# Altium schematic symbol library FPGA_Xilinx_Virtex7.SchLib: 34 symbols (part 14 of 26) (continued)
## XC7VX485T-FFG1930 (continued)
part R pins: AA3 GND, AA4 GND, AA7 GND, AA8 GND, AA9 GND, AA12 GND, AA14 GND, AA16 GND, AA18 GND, AA20 GND, AA24 GND, AA26 GND, AA28 GND, AA30 GND, AA32 GND, AA42 GND, AB1 GND, AB5 GND, AB9 GND, AB13 GND, AB15 GND, AB17 GND, AB19 GND, AB21 GND, AB25 GND, AB27 GND, AB29 GND, AB31 GND, AB33 GND, AB39 GND, AC3 GND, AC7 GND, AC9 GND, AC12 GND, AC14 GND, AC16 GND, AC18 GND, AC20 GND, AC24 GND, AC26 GND, AC28 GND, AC30 GND, AC32 GND, AC36 GND, AD1 GND, AD2 GND, AD5 GND, AD6 GND, AD9 GND, AD13 GND, AD15 GND, AD17 GND, AD19 GND, AD21 GND, AD25 GND, AD27 GND, AD29 GND, AD31 GND, AD33 GND, AD43 GND, AE3 GND, AE4 GND, AE7 GND, AE8 GND, AE9 GND, AE12 GND, AE14 GND, AE16 GND, AE18 GND, AE20 GND, AE22 GND, AE24 GND, AE26 GND, AE28 GND, AE30 GND, AE32 GND, AE40 GND, AF1 GND, AF5 GND, AF9 GND, AF13 GND, AF15 GND, AF17 GND, AF19 GND, AF21 GND, AF23 GND, AF25 GND, AF27 GND, AF29 GND, AF31 GND, AF33 GND, AF37 GND, AG3 GND, AG7 GND, AG9 GND, AG12 GND, AG14 GND, AG16 GND, AG18 GND, AG20 GND, AG22 GND, AG24 GND, AG26 GND, AG28 GND, AG30 GND, AG32 GND, AG34 GND, AG44 GND, AH1 GND, AH2 GND, AH5 GND, AH7 GND, AH8 GND, AH9 GND, AH13 GND, AH21 GND, AH31 GND, AH33 GND, AH41 GND, AJ3 GND, AJ4 GND, AJ7 GND, AJ9 GND, AJ18 GND, AJ28 GND, AJ38 GND, AK1 GND, AK5 GND, AK9 GND, AK15 GND, AK25 GND, AK35 GND, AL3 GND, AL7 GND, AL9 GND, AL12 GND, AL22 GND, AL32 GND, AL42 GND, AM1 GND, AM2 GND, AM5 GND, AM6 GND, AM9 GND, AM19 GND, AM29 GND, AM39 GND, AN3 GND, AN4 GND, AN7 GND, AN8 GND, AN9 GND, AN16 GND, AN26 GND, AN36 GND, AP1 GND, AP5 GND, AP9 GND, AP13 GND, AP23 GND, AP33 GND, AP43 GND, AR3 GND, AR7 GND, AR9 GND, AR10 GND, AR20 GND, AR30 GND, AR40 GND, AT1 GND, AT2 GND, AT5 GND, AT6 GND, AT9 GND, AT17 GND, AT27 GND, AT37 GND, AU3 GND, AU4 GND, AU7 GND, AU8 GND, AU9 GND, AU14 GND, AU24 GND, AU34 GND, AU44 GND, AV1 GND, AV5 GND, AV9 GND, AV11 GND, AV21 GND, AV31 GND, AV41 GND, AW3 GND, AW7 GND, AW9 GND, AW18 GND, AW28 GND, AW38 GND, AY1 GND, AY2 GND, AY5 GND, AY6 GND, AY9 GND, AY15 GND, AY25 GND, AY35 GND, BA3 GND, BA4 GND, BA7 GND, BA8 GND, BA9 GND, BA12 GND, BA22 GND, BA32 GND, BA42 GND, BB1 GND, BB5 GND, BB9 GND, BB19 GND, BB29 GND, BB39 GND, BC2 GND, BC3 GND, BC7 GND, BC9 GND, BC16 GND, BC26 GND, BC36 GND, BD5 GND, BD6 GND, BD9 GND, BD13 GND, BD23 GND, BD33 GND, U44 GND, V1 GND, V5 GND, V9 GND, V13 GND, V15 GND, V17 GND, V19 GND, V21 GND, V23 GND, V25 GND, V27 GND, V29 GND, V31 GND, V33 GND, V41 GND, W3 GND, W7 GND, W9 GND, W12 GND, W14 GND, W16 GND, W18 GND, W20 GND, W22 GND, W24 GND, W26 GND, W28 GND, W30 GND, W32 GND, W38 GND, Y1 GND, Y2 GND, Y5 GND, Y6 GND, Y9 GND, Y13 GND, Y15 GND, Y17 GND, Y19 GND, Y21 GND, Y23 GND, Y25 GND, Y27 GND, Y29 GND, Y31 GND, Y33 GND, Y35 GND

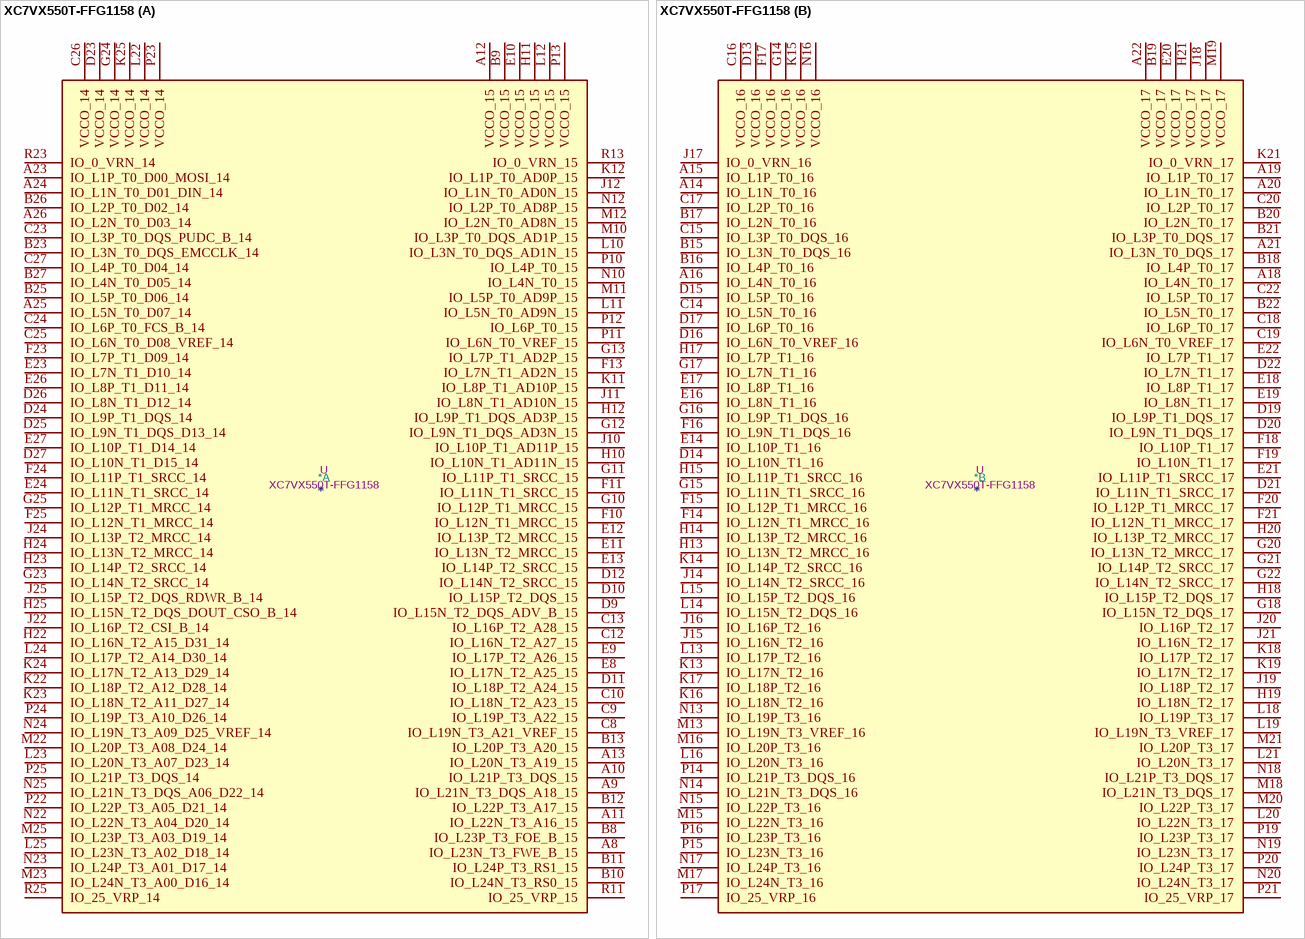
[diagram p97: symbol XC7VX550T-FFG1158]

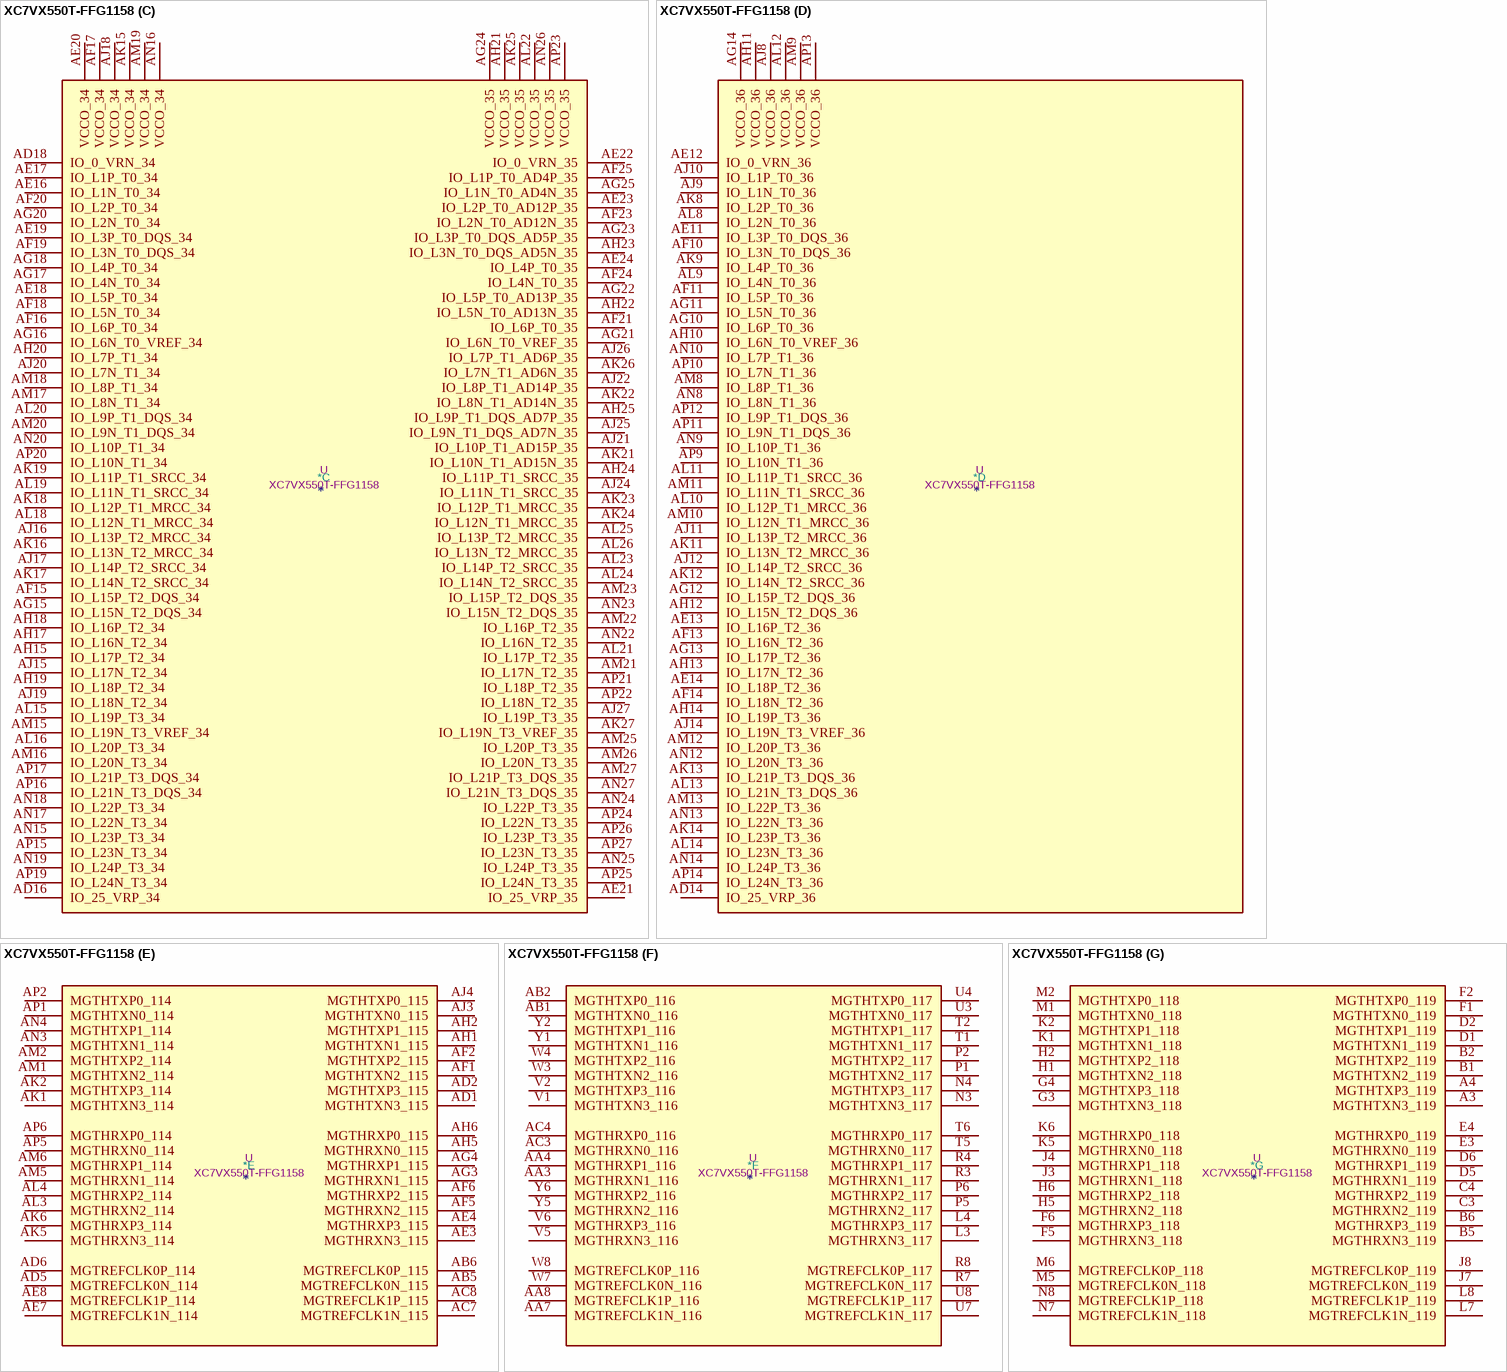
[diagram p98: symbol XC7VX550T-FFG1158]

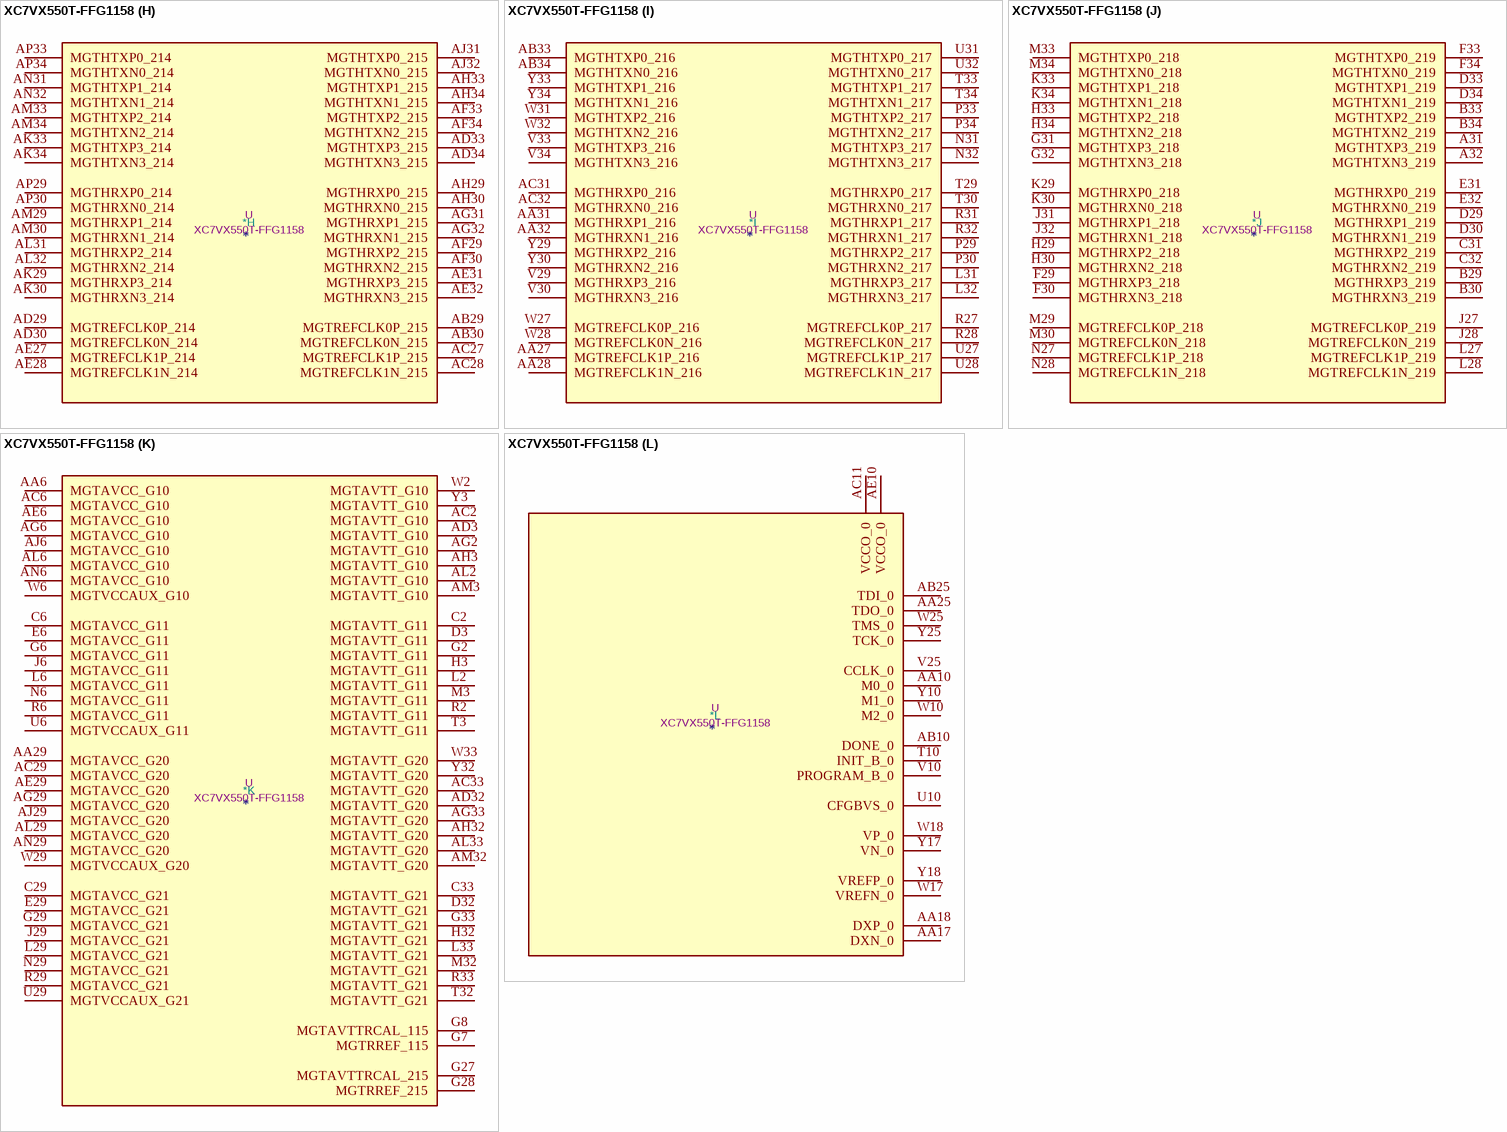
[diagram p99: symbol XC7VX550T-FFG1158]

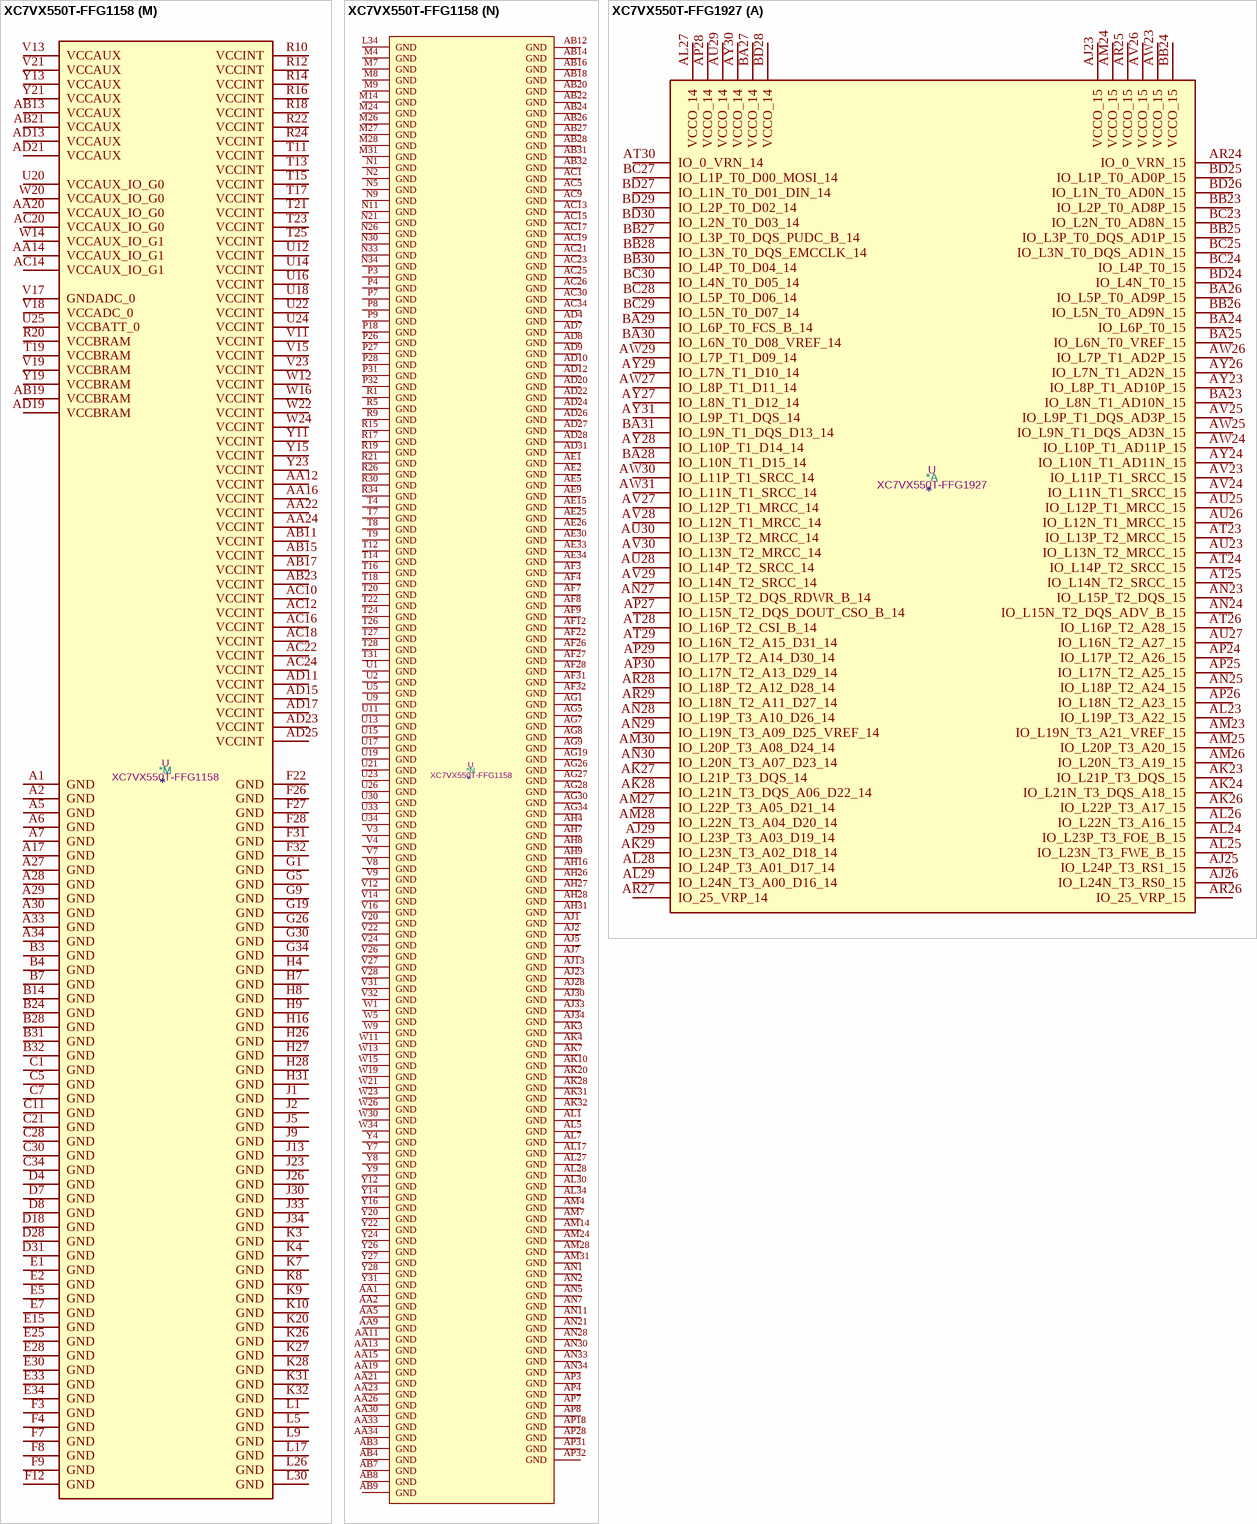
[diagram p100: symbols XC7VX550T-FFG1158 to XC7VX550T-FFG1927]

## XC7VX550T-FFG1158
designator *  value XC7VX550T-FFG1158  Reference: U
ki_keywords: FPGA; ki_description: Virtex 7 XT 550 XC7VX550T-FFG1158
part A pins: A8 IO_L23N_T3_FWE_B_15, A9 IO_L21N_T3_DQS_A18_15, A10 IO_L21P_T3_DQS_15, A11 IO_L22N_T3_A16_15, A12 VCCO_15, A13 IO_L20N_T3_A19_15, A23 IO_L1P_T0_D00_MOSI_14, A24 IO_L1N_T0_D01_DIN_14, A25 IO_L5N_T0_D07_14, A26 IO_L2N_T0_D03_14, B8 IO_L23P_T3_FOE_B_15, B9 VCCO_15, B10 IO_L24N_T3_RS0_15, B11 IO_L24P_T3_RS1_15, B12 IO_L22P_T3_A17_15, B13 IO_L20P_T3_A20_15, B23 IO_L3N_T0_DQS_EMCCLK_14, B25 IO_L5P_T0_D06_14, B26 IO_L2P_T0_D02_14, B27 IO_L4N_T0_D05_14, C8 IO_L19N_T3_A21_VREF_15, C9 IO_L19P_T3_A22_15, C10 IO_L18N_T2_A23_15, C12 IO_L16N_T2_A27_15, C13 IO_L16P_T2_A28_15, C23 IO_L3P_T0_DQS_PUDC_B_14, C24 IO_L6P_T0_FCS_B_14, C25 IO_L6N_T0_D08_VREF_14, C26 VCCO_14, C27 IO_L4P_T0_D04_14, D9 IO_L15N_T2_DQS_ADV_B_15, D10 IO_L15P_T2_DQS_15, D11 IO_L18P_T2_A24_15, D12 IO_L14N_T2_SRCC_15, D23 VCCO_14, D24 IO_L9P_T1_DQS_14, D25 IO_L9N_T1_DQS_D13_14, D26 IO_L8N_T1_D12_14, D27 IO_L10N_T1_D15_14, E8 IO_L17N_T2_A25_15, E9 IO_L17P_T2_A26_15, E10 VCCO_15, E11 IO_L13N_T2_MRCC_15, E12 IO_L13P_T2_MRCC_15, E13 IO_L14P_T2_SRCC_15, E23 IO_L7N_T1_D10_14, E24 IO_L11N_T1_SRCC_14, E26 IO_L8P_T1_D11_14, E27 IO_L10P_T1_D14_14, F10 IO_L12N_T1_MRCC_15, F11 IO_L11N_T1_SRCC_15, F13 IO_L7N_T1_AD2N_15, F23 IO_L7P_T1_D09_14, F24 IO_L11P_T1_SRCC_14, F25 IO_L12N_T1_MRCC_14, G10 IO_L12P_T1_MRCC_15, G11 IO_L11P_T1_SRCC_15, G12 IO_L9N_T1_DQS_AD3N_15, G13 IO_L7P_T1_AD2P_15, G23 IO_L14N_T2_SRCC_14, G24 VCCO_14, G25 IO_L12P_T1_MRCC_14, H10 IO_L10N_T1_AD11N_15, H11 VCCO_15, H12 IO_L9P_T1_DQS_AD3P_15, H22 IO_L16N_T2_A15_D31_14, H23 IO_L14P_T2_SRCC_14, H24 IO_L13N_T2_MRCC_14, H25 IO_L15N_T2_DQS_DOUT_CSO_B_14, J10 IO_L10P_T1_AD11P_15, J11 IO_L8N_T1_AD10N_15, J12 IO_L1N_T0_AD0N_15, J22 IO_L16P_T2_CSI_B_14, J24 IO_L13P_T2_MRCC_14, J25 IO_L15P_T2_DQS_RDWR_B_14, K11 IO_L8P_T1_AD10P_15, K12 IO_L1P_T0_AD0P_15, K22 IO_L18P_T2_A12_D28_14, K23 IO_L18N_T2_A11_D27_14, K24 IO_L17N_T2_A13_D29_14, K25 VCCO_14, L10 IO_L3N_T0_DQS_AD1N_15, L11 IO_L5N_T0_AD9N_15, L12 VCCO_15, L22 VCCO_14, L23 IO_L20N_T3_A07_D23_14, L24 IO_L17P_T2_A14_D30_14, L25 IO_L23N_T3_A02_D18_14, M10 IO_L3P_T0_DQS_AD1P_15, M11 IO_L5P_T0_AD9P_15, M12 IO_L2N_T0_AD8N_15, M22 IO_L20P_T3_A08_D24_14, M23 IO_L24N_T3_A00_D16_14, M25 IO_L23P_T3_A03_D19_14, N10 IO_L4N_T0_15, N12 IO_L2P_T0_AD8P_15, N22 IO_L22N_T3_A04_D20_14, N23 IO_L24P_T3_A01_D17_14, N24 IO_L19N_T3_A09_D25_VREF_14, N25 IO_L21N_T3_DQS_A06_D22_14, P10 IO_L4P_T0_15, P11 IO_L6N_T0_VREF_15, P12 IO_L6P_T0_15, P13 VCCO_15, P22 IO_L22P_T3_A05_D21_14, P23 VCCO_14, P24 IO_L19P_T3_A10_D26_14, P25 IO_L21P_T3_DQS_14, R11 IO_25_VRP_15, R13 IO_0_VRN_15, R23 IO_0_VRN_14, R25 IO_25_VRP_14
part B pins: A14 IO_L1N_T0_16, A15 IO_L1P_T0_16, A16 IO_L4N_T0_16, A18 IO_L4N_T0_17, A19 IO_L1P_T0_17, A20 IO_L1N_T0_17, A21 IO_L3N_T0_DQS_17, A22 VCCO_17, B15 IO_L3N_T0_DQS_16, B16 IO_L4P_T0_16, B17 IO_L2N_T0_16, B18 IO_L4P_T0_17, B19 VCCO_17, B20 IO_L2N_T0_17, B21 IO_L3P_T0_DQS_17, B22 IO_L5N_T0_17, C14 IO_L5N_T0_16, C15 IO_L3P_T0_DQS_16, C16 VCCO_16, C17 IO_L2P_T0_16, C18 IO_L6P_T0_17, C19 IO_L6N_T0_VREF_17, C20 IO_L2P_T0_17, C22 IO_L5P_T0_17, D13 VCCO_16, D14 IO_L10N_T1_16, D15 IO_L5P_T0_16, D16 IO_L6N_T0_VREF_16, D17 IO_L6P_T0_16, D19 IO_L9P_T1_DQS_17, D20 IO_L9N_T1_DQS_17, D21 IO_L11N_T1_SRCC_17, D22 IO_L7N_T1_17, E14 IO_L10P_T1_16, E16 IO_L8N_T1_16, E17 IO_L8P_T1_16, E18 IO_L8P_T1_17, E19 IO_L8N_T1_17, E20 VCCO_17, E21 IO_L11P_T1_SRCC_17, E22 IO_L7P_T1_17, F14 IO_L12N_T1_MRCC_16, F15 IO_L12P_T1_MRCC_16, F16 IO_L9N_T1_DQS_16, F17 VCCO_16, F18 IO_L10P_T1_17, F19 IO_L10N_T1_17, F20 IO_L12P_T1_MRCC_17, F21 IO_L12N_T1_MRCC_17, G14 VCCO_16, G15 IO_L11N_T1_SRCC_16, G16 IO_L9P_T1_DQS_16, G17 IO_L7N_T1_16, G18 IO_L15N_T2_DQS_17, G20 IO_L13N_T2_MRCC_17, G21 IO_L14P_T2_SRCC_17, G22 IO_L14N_T2_SRCC_17, H13 IO_L13N_T2_MRCC_16, H14 IO_L13P_T2_MRCC_16, H15 IO_L11P_T1_SRCC_16, H17 IO_L7P_T1_16, H18 IO_L15P_T2_DQS_17, H19 IO_L18N_T2_17, H20 IO_L13P_T2_MRCC_17, H21 VCCO_17, J14 IO_L14N_T2_SRCC_16, J15 IO_L16N_T2_16, J16 IO_L16P_T2_16, J17 IO_0_VRN_16, J18 VCCO_17, J19 IO_L18P_T2_17, J20 IO_L16P_T2_17, J21 IO_L16N_T2_17, K13 IO_L17N_T2_16, K14 IO_L14P_T2_SRCC_16, K15 VCCO_16, K16 IO_L18N_T2_16, K17 IO_L18P_T2_16, K18 IO_L17P_T2_17, K19 IO_L17N_T2_17, K21 IO_0_VRN_17, L13 IO_L17P_T2_16, L14 IO_L15N_T2_DQS_16, L15 IO_L15P_T2_DQS_16, L16 IO_L20N_T3_16, L18 IO_L19P_T3_17, L19 IO_L19N_T3_VREF_17, L20 IO_L22N_T3_17, L21 IO_L20N_T3_17, M13 IO_L19N_T3_VREF_16, M15 IO_L22N_T3_16, M16 IO_L20P_T3_16, M17 IO_L24N_T3_16, M18 IO_L21N_T3_DQS_17, M19 VCCO_17, M20 IO_L22P_T3_17, M21 IO_L20P_T3_17, N13 IO_L19P_T3_16, N14 IO_L21N_T3_DQS_16, N15 IO_L22P_T3_16, N16 VCCO_16, N17 IO_L24P_T3_16, N18 IO_L21P_T3_DQS_17, N19 IO_L23N_T3_17, N20 IO_L24N_T3_17, P14 IO_L21P_T3_DQS_16, P15 IO_L23N_T3_16, P16 IO_L23P_T3_16, P17 IO_25_VRP_16, P19 IO_L23P_T3_17, P20 IO_L24P_T3_17, P21 IO_25_VRP_17
part C pins: AD16 IO_25_VRP_34, AD18 IO_0_VRN_34, AE16 IO_L1N_T0_34, AE17 IO_L1P_T0_34, AE18 IO_L5P_T0_34, AE19 IO_L3P_T0_DQS_34, AE20 VCCO_34, AE21 IO_25_VRP_35, AE22 IO_0_VRN_35, AE23 IO_L2P_T0_AD12P_35, AE24 IO_L4P_T0_35, AF15 IO_L15P_T2_DQS_34, AF16 IO_L6P_T0_34, AF17 VCCO_34, AF18 IO_L5N_T0_34, AF19 IO_L3N_T0_DQS_34, AF20 IO_L2P_T0_34, AF21 IO_L6P_T0_35, AF23 IO_L2N_T0_AD12N_35, AF24 IO_L4N_T0_35, AF25 IO_L1P_T0_AD4P_35, AG15 IO_L15N_T2_DQS_34, AG16 IO_L6N_T0_VREF_34, AG17 IO_L4N_T0_34, AG18 IO_L4P_T0_34, AG20 IO_L2N_T0_34, AG21 IO_L6N_T0_VREF_35, AG22 IO_L5P_T0_AD13P_35, AG23 IO_L3P_T0_DQS_AD5P_35, AG24 VCCO_35, AG25 IO_L1N_T0_AD4N_35, AH15 IO_L17P_T2_34, AH17 IO_L16N_T2_34, AH18 IO_L16P_T2_34, AH19 IO_L18P_T2_34, AH20 IO_L7P_T1_34, AH21 VCCO_35, AH22 IO_L5N_T0_AD13N_35, AH23 IO_L3N_T0_DQS_AD5N_35, AH24 IO_L11P_T1_SRCC_35, AH25 IO_L9P_T1_DQS_AD7P_35, AJ15 IO_L17N_T2_34, AJ16 IO_L13P_T2_MRCC_34, AJ17 IO_L14P_T2_SRCC_34, AJ18 VCCO_34, AJ19 IO_L18N_T2_34, AJ20 IO_L7N_T1_34, AJ21 IO_L10P_T1_AD15P_35, AJ22 IO_L8P_T1_AD14P_35, AJ24 IO_L11N_T1_SRCC_35, AJ25 IO_L9N_T1_DQS_AD7N_35, AJ26 IO_L7P_T1_AD6P_35, AJ27 IO_L19P_T3_35, AK15 VCCO_34, AK16 IO_L13N_T2_MRCC_34, AK17 IO_L14N_T2_SRCC_34, AK18 IO_L12P_T1_MRCC_34, AK19 IO_L11P_T1_SRCC_34, AK21 IO_L10N_T1_AD15N_35, AK22 IO_L8N_T1_AD14N_35, AK23 IO_L12P_T1_MRCC_35, AK24 IO_L12N_T1_MRCC_35, AK25 VCCO_35, AK26 IO_L7N_T1_AD6N_35, AK27 IO_L19N_T3_VREF_35, AL15 IO_L19P_T3_34, AL16 IO_L20P_T3_34, AL18 IO_L12N_T1_MRCC_34, AL19 IO_L11N_T1_SRCC_34, AL20 IO_L9P_T1_DQS_34, AL21 IO_L17P_T2_35, AL22 VCCO_35, AL23 IO_L14P_T2_SRCC_35, AL24 IO_L14N_T2_SRCC_35, AL25 IO_L13P_T2_MRCC_35, AL26 IO_L13N_T2_MRCC_35, AM15 IO_L19N_T3_VREF_34, AM16 IO_L20N_T3_34, AM17 IO_L8N_T1_34, AM18 IO_L8P_T1_34, AM19 VCCO_34, AM20 IO_L9N_T1_DQS_34, AM21 IO_L17N_T2_35, AM22 IO_L16P_T2_35, AM23 IO_L15P_T2_DQS_35, AM25 IO_L20P_T3_35, AM26 IO_L20N_T3_35, AM27 IO_L21P_T3_DQS_35, AN15 IO_L23P_T3_34, AN16 VCCO_34, AN17 IO_L22N_T3_34, AN18 IO_L22P_T3_34, AN19 IO_L24P_T3_34, AN20 IO_L10P_T1_34, AN22 IO_L16N_T2_35, AN23 IO_L15N_T2_DQS_35, AN24 IO_L22P_T3_35, AN25 IO_L24P_T3_35, AN26 VCCO_35, AN27 IO_L21N_T3_DQS_35, AP15 IO_L23N_T3_34, AP16 IO_L21N_T3_DQS_34, AP17 IO_L21P_T3_DQS_34, AP19 IO_L24N_T3_34, AP20 IO_L10N_T1_34, AP21 IO_L18P_T2_35, AP22 IO_L18N_T2_35, AP23 VCCO_35, AP24 IO_L22N_T3_35, AP25 IO_L24N_T3_35, AP26 IO_L23P_T3_35, AP27 IO_L23N_T3_35
part D pins: AD14 IO_25_VRP_36, AE11 IO_L3P_T0_DQS_36, AE12 IO_0_VRN_36, AE13 IO_L16P_T2_36, AE14 IO_L18P_T2_36, AF10 IO_L3N_T0_DQS_36, AF11 IO_L5P_T0_36, AF13 IO_L16N_T2_36, AF14 IO_L18N_T2_36, AG10 IO_L6P_T0_36, AG11 IO_L5N_T0_36, AG12 IO_L15P_T2_DQS_36, AG13 IO_L17P_T2_36, AG14 VCCO_36, AH10 IO_L6N_T0_VREF_36, AH11 VCCO_36, AH12 IO_L15N_T2_DQS_36, AH13 IO_L17N_T2_36, AH14 IO_L19P_T3_36, AJ8 VCCO_36, AJ9 IO_L1N_T0_36, AJ10 IO_L1P_T0_36, AJ11 IO_L13P_T2_MRCC_36, AJ12 IO_L14P_T2_SRCC_36, AJ14 IO_L19N_T3_VREF_36, AK8 IO_L2P_T0_36, AK9 IO_L4P_T0_36, AK11 IO_L13N_T2_MRCC_36, AK12 IO_L14N_T2_SRCC_36, AK13 IO_L21P_T3_DQS_36, AK14 IO_L23P_T3_36, AL8 IO_L2N_T0_36, AL9 IO_L4N_T0_36, AL10 IO_L12P_T1_MRCC_36, AL11 IO_L11P_T1_SRCC_36, AL12 VCCO_36, AL13 IO_L21N_T3_DQS_36, AL14 IO_L23N_T3_36, AM8 IO_L8P_T1_36, AM9 VCCO_36, AM10 IO_L12N_T1_MRCC_36, AM11 IO_L11N_T1_SRCC_36, AM12 IO_L20P_T3_36, AM13 IO_L22P_T3_36, AN8 IO_L8N_T1_36, AN9 IO_L10P_T1_36, AN10 IO_L7P_T1_36, AN12 IO_L20N_T3_36, AN13 IO_L22N_T3_36, AN14 IO_L24P_T3_36, AP9 IO_L10N_T1_36, AP10 IO_L7N_T1_36, AP11 IO_L9N_T1_DQS_36, AP12 IO_L9P_T1_DQS_36, AP13 VCCO_36, AP14 IO_L24N_T3_36
part E pins: AB5 MGTREFCLK0N_115, AB6 MGTREFCLK0P_115, AC7 MGTREFCLK1N_115, AC8 MGTREFCLK1P_115, AD1 MGTHTXN3_115, AD2 MGTHTXP3_115, AD5 MGTREFCLK0N_114, AD6 MGTREFCLK0P_114, AE3 MGTHRXN3_115, AE4 MGTHRXP3_115, AE7 MGTREFCLK1N_114, AE8 MGTREFCLK1P_114, AF1 MGTHTXN2_115, AF2 MGTHTXP2_115, AF5 MGTHRXN2_115, AF6 MGTHRXP2_115, AG3 MGTHRXN1_115, AG4 MGTHRXP1_115, AH1 MGTHTXN1_115, AH2 MGTHTXP1_115, AH5 MGTHRXN0_115, AH6 MGTHRXP0_115, AJ3 MGTHTXN0_115, AJ4 MGTHTXP0_115, AK1 MGTHTXN3_114, AK2 MGTHTXP3_114, AK5 MGTHRXN3_114, AK6 MGTHRXP3_114, AL3 MGTHRXN2_114, AL4 MGTHRXP2_114, AM1 MGTHTXN2_114, AM2 MGTHTXP2_114, AM5 MGTHRXN1_114, AM6 MGTHRXP1_114, AN3 MGTHTXN1_114, AN4 MGTHTXP1_114, AP1 MGTHTXN0_114, AP2 MGTHTXP0_114, AP5 MGTHRXN0_114, AP6 MGTHRXP0_114
part F pins: AA3 MGTHRXN1_116, AA4 MGTHRXP1_116, AA7 MGTREFCLK1N_116, AA8 MGTREFCLK1P_116, AB1 MGTHTXN0_116, AB2 MGTHTXP0_116, AC3 MGTHRXN0_116, AC4 MGTHRXP0_116, L3 MGTHRXN3_117, L4 MGTHRXP3_117, N3 MGTHTXN3_117, N4 MGTHTXP3_117, P1 MGTHTXN2_117, P2 MGTHTXP2_117, P5 MGTHRXN2_117, P6 MGTHRXP2_117, R3 MGTHRXN1_117, R4 MGTHRXP1_117, R7 MGTREFCLK0N_117, R8 MGTREFCLK0P_117, T1 MGTHTXN1_117, T2 MGTHTXP1_117, T5 MGTHRXN0_117, T6 MGTHRXP0_117, U3 MGTHTXN0_117, U4 MGTHTXP0_117, U7 MGTREFCLK1N_117, U8 MGTREFCLK1P_117, V1 MGTHTXN3_116, V2 MGTHTXP3_116, V5 MGTHRXN3_116, V6 MGTHRXP3_116, W3 MGTHTXN2_116, W4 MGTHTXP2_116, W7 MGTREFCLK0N_116, W8 MGTREFCLK0P_116, Y1 MGTHTXN1_116, Y2 MGTHTXP1_116, Y5 MGTHRXN2_116, Y6 MGTHRXP2_116